# Altium footprint library General.PcbLib: 446 footprints (part 22 of 28)
Each footprint in its own frame and in the unit in brackets; x right, y up, seen from the top. Pads: shape width x height; smd on the part's side, far side on the other; paste and mask are expansions set on the pad; w line width, h text height; cw(c..) or ccw(c..) is an arc to the next point about the centre after c.
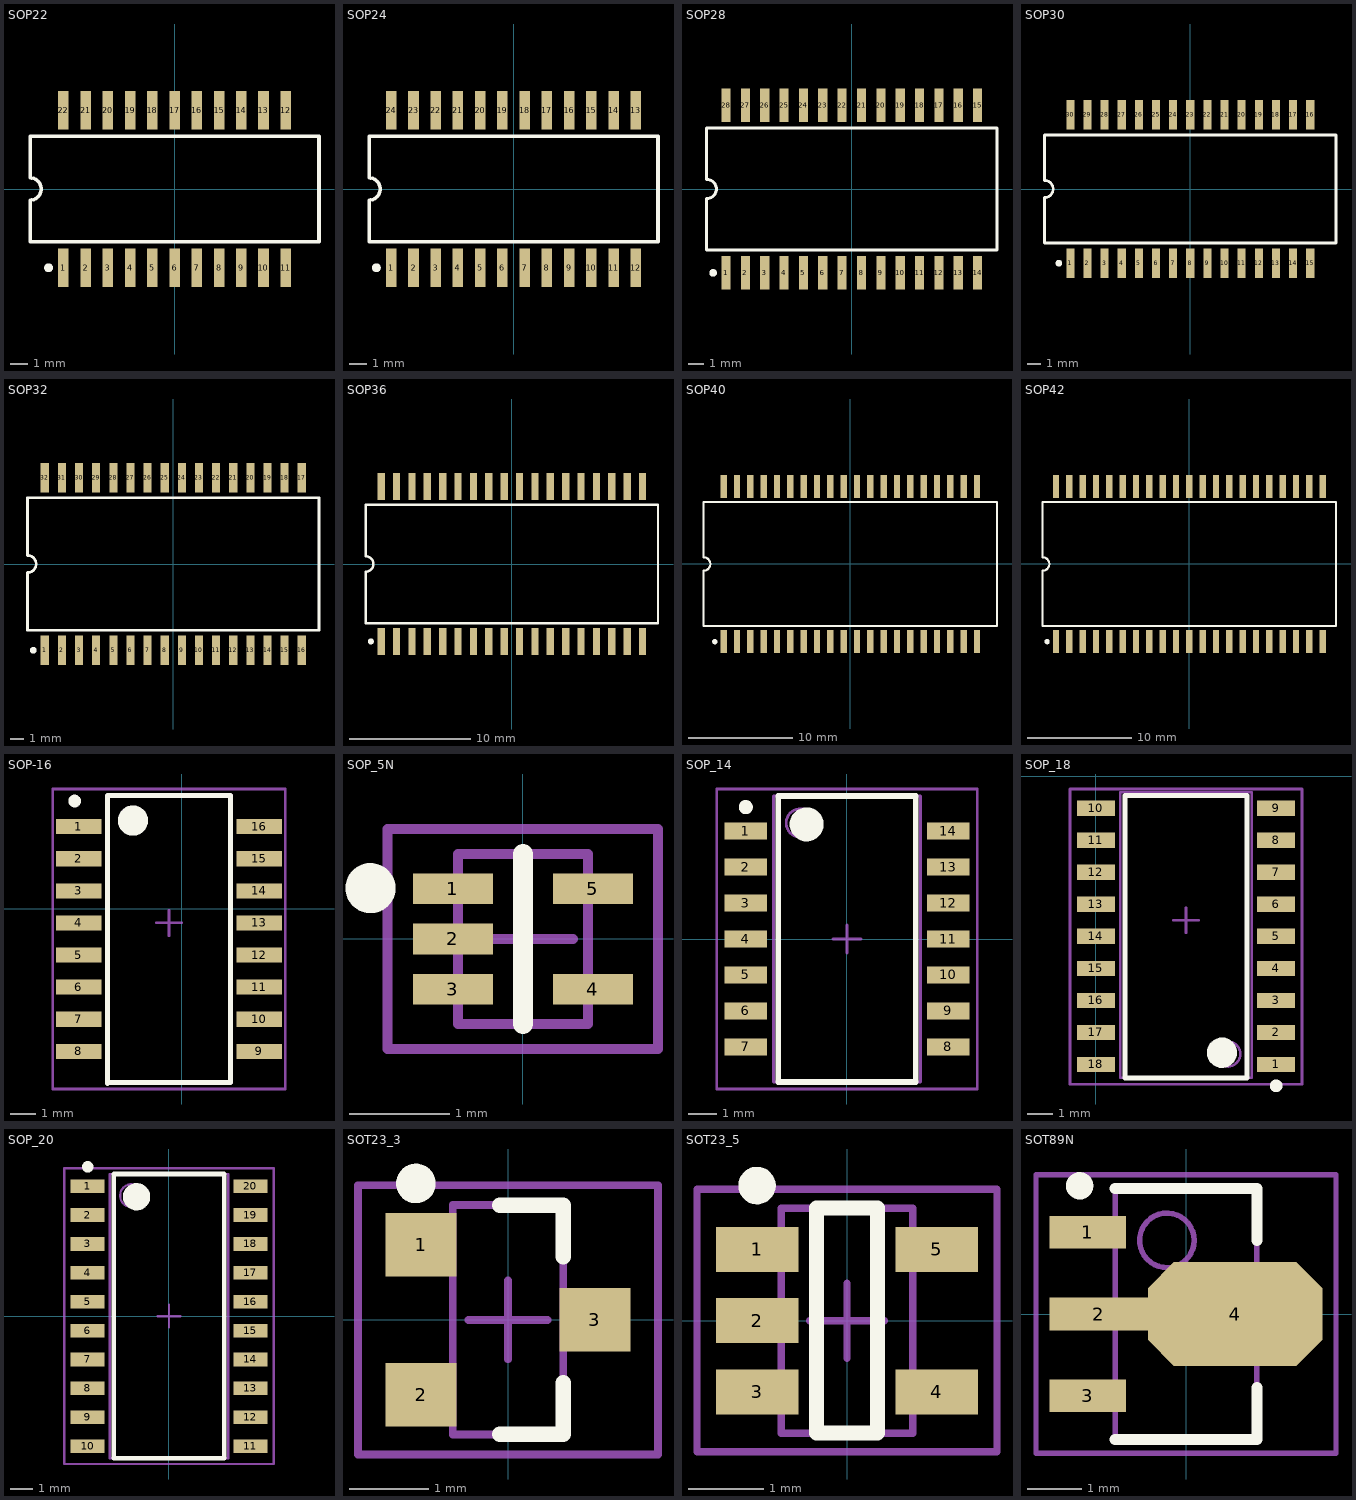
[diagram p21: the footprints below, top view; thin cyan lines are the x and y axes]

## SOP22 [mm] "Small Outline; 22 Leads; Body Width 7.2 mm; Pitch 1.27 mm"
height 2.5
pads (22):
  rect 0.6x2.2 smd: 1(-6.35,-4.5) 2(-5.08,-4.5) 3(-3.81,-4.5) 4(-2.54,-4.5) 5(-1.27,-4.5) 6(0,-4.5) 7(1.27,-4.5) 8(2.54,-4.5) 9(3.81,-4.5) 10(5.08,-4.5) 11(6.35,-4.5) 12(6.35,4.5) 13(5.08,4.5) 14(3.81,4.5) 15(2.54,4.5) 16(1.27,4.5) 17(0,4.5) 18(-1.27,4.5) 19(-2.54,4.5) 20(-3.81,4.5) 21(-5.08,4.5) 22(-6.35,4.5)
Top Overlay:
  circle w0.25: c-7.2,-4.5 r0.125
  lines w0.2: -8.25,-3 -8.25,-0.635 ccw(c-8.25,0) -8.25,0.635 -8.25,3 8.25,3 8.25,-3 -8.25,-3

## SOP24 [mm] "Small Outline; 24 Leads; Body Width 7.2 mm; Pitch 1.27 mm"
height 2.5
pads (24):
  rect 0.6x2.2 smd: 1(-6.985,-4.5) 2(-5.715,-4.5) 3(-4.445,-4.5) 4(-3.175,-4.5) 5(-1.905,-4.5) 6(-0.635,-4.5) 7(0.635,-4.5) 8(1.905,-4.5) 9(3.175,-4.5) 10(4.445,-4.5) 11(5.715,-4.5) 12(6.985,-4.5) 13(6.985,4.5) 14(5.715,4.5) 15(4.445,4.5) 16(3.175,4.5) 17(1.905,4.5) 18(0.635,4.5) 19(-0.635,4.5) 20(-1.905,4.5) 21(-3.175,4.5) 22(-4.445,4.5) 23(-5.715,4.5) 24(-6.985,4.5)
Top Overlay:
  circle w0.25: c-7.835,-4.5 r0.125
  lines w0.2: -8.25,-3 -8.25,-0.635 ccw(c-8.25,0) -8.25,0.635 -8.25,3 8.25,3 8.25,-3 -8.25,-3

## SOP28 [mm] "Small Outline; 28 Leads; Body Width 9.1 mm; Pitch 1.27 mm"
height 3
pads (28):
  rect 0.6x2.2 smd: 1(-8.255,-5.5) 2(-6.985,-5.5) 3(-5.715,-5.5) 4(-4.445,-5.5) 5(-3.175,-5.5) 6(-1.905,-5.5) 7(-0.635,-5.5) 8(0.635,-5.5) 9(1.905,-5.5) 10(3.175,-5.5) 11(4.445,-5.5) 12(5.715,-5.5) 13(6.985,-5.5) 14(8.255,-5.5) 15(8.255,5.5) 16(6.985,5.5) 17(5.715,5.5) 18(4.445,5.5) 19(3.175,5.5) 20(1.905,5.5) 21(0.635,5.5) 22(-0.635,5.5) 23(-1.905,5.5) 24(-3.175,5.5) 25(-4.445,5.5) 26(-5.715,5.5) 27(-6.985,5.5) 28(-8.255,5.5)
Top Overlay:
  circle w0.25: c-9.105,-5.5 r0.125
  lines w0.2: -9.525,-4 -9.525,-0.635 ccw(c-9.525,0) -9.525,0.635 -9.525,4 9.525,4 9.525,-4 -9.525,-4

## SOP30 [mm] "Small Outline; 30 Leads; Body Width 9.1 mm; Pitch 1.27 mm"
height 3
pads (30):
  rect 0.6x2.2 smd: 1(-8.89,-5.5) 2(-7.62,-5.5) 3(-6.35,-5.5) 4(-5.08,-5.5) 5(-3.81,-5.5) 6(-2.54,-5.5) 7(-1.27,-5.5) 8(0,-5.5) 9(1.27,-5.5) 10(2.54,-5.5) 11(3.81,-5.5) 12(5.08,-5.5) 13(6.35,-5.5) 14(7.62,-5.5) 15(8.89,-5.5) 16(8.89,5.5) 17(7.62,5.5) 18(6.35,5.5) 19(5.08,5.5) 20(3.81,5.5) 21(2.54,5.5) 22(1.27,5.5) 23(0,5.5) 24(-1.27,5.5) 25(-2.54,5.5) 26(-3.81,5.5) 27(-5.08,5.5) 28(-6.35,5.5) 29(-7.62,5.5) 30(-8.89,5.5)
Top Overlay:
  circle w0.25: c-9.74,-5.5 r0.125
  lines w0.2: -10.8,-4 10.8,-4 10.8,4 -10.8,4 -10.8,0.635 cw(c-10.8,0) -10.8,-0.635 -10.8,-4

## SOP32 [mm] "Small Outline; 32 Leads; Body Width 11 mm; Pitch 1.27 mm"
height 3.5
pads (32):
  rect 0.6x2.2 smd: 1(-9.525,-6.4) 2(-8.255,-6.4) 3(-6.985,-6.4) 4(-5.715,-6.4) 5(-4.445,-6.4) 6(-3.175,-6.4) 7(-1.905,-6.4) 8(-0.635,-6.4) 9(0.635,-6.4) 10(1.905,-6.4) 11(3.175,-6.4) 12(4.445,-6.4) 13(5.715,-6.4) 14(6.985,-6.4) 15(8.255,-6.4) 16(9.525,-6.4) 17(9.525,6.4) 18(8.255,6.4) 19(6.985,6.4) 20(5.715,6.4) 21(4.445,6.4) 22(3.175,6.4) 23(1.905,6.4) 24(0.635,6.4) 25(-0.635,6.4) 26(-1.905,6.4) 27(-3.175,6.4) 28(-4.445,6.4) 29(-5.715,6.4) 30(-6.985,6.4) 31(-8.255,6.4) 32(-9.525,6.4)
Top Overlay:
  circle w0.25: c-10.375,-6.4 r0.125
  lines w0.2: -10.8,-4.9 -10.8,-0.635 ccw(c-10.8,0) -10.8,0.635 -10.8,4.9 10.8,4.9 10.8,-4.9 -10.8,-4.9

## SOP36 [mm] "Small Outline; 36 Leads; Body Width 11 mm; Pitch 1.27 mm"
height 3.5
pads (36):
  rect 0.6x2.2 smd: 1(-10.795,-6.4) 2(-9.525,-6.4) 3(-8.255,-6.4) 4(-6.985,-6.4) 5(-5.715,-6.4) 6(-4.445,-6.4) 7(-3.175,-6.4) 8(-1.905,-6.4) 9(-0.635,-6.4) 10(0.635,-6.4) 11(1.905,-6.4) 12(3.175,-6.4) 13(4.445,-6.4) 14(5.715,-6.4) 15(6.985,-6.4) 16(8.255,-6.4) 17(9.525,-6.4) 18(10.795,-6.4) 19(10.795,6.4) 20(9.525,6.4) 21(8.255,6.4) 22(6.985,6.4) 23(5.715,6.4) 24(4.445,6.4) 25(3.175,6.4) 26(1.905,6.4) 27(0.635,6.4) 28(-0.635,6.4) 29(-1.905,6.4) 30(-3.175,6.4) 31(-4.445,6.4) 32(-5.715,6.4) 33(-6.985,6.4) 34(-8.255,6.4) 35(-9.525,6.4) 36(-10.795,6.4)
Top Overlay:
  circle w0.25: c-11.645,-6.4 r0.125
  lines w0.2: -12.075,-4.9 12.075,-4.9 12.075,4.9 -12.075,4.9 -12.075,0.635 cw(c-12.075,0) -12.075,-0.635 -12.075,-4.9

## SOP40 [mm] "Small Outline; 40 Leads; Body Width 12.9 mm; Pitch 1.27 mm"
height 4
pads (40):
  rect 0.6x2.2 smd: 1(-12.065,-7.4) 2(-10.795,-7.4) 3(-9.525,-7.4) 4(-8.255,-7.4) 5(-6.985,-7.4) 6(-5.715,-7.4) 7(-4.445,-7.4) 8(-3.175,-7.4) 9(-1.905,-7.4) 10(-0.635,-7.4) 11(0.635,-7.4) 12(1.905,-7.4) 13(3.175,-7.4) 14(4.445,-7.4) 15(5.715,-7.4) 16(6.985,-7.4) 17(8.255,-7.4) 18(9.525,-7.4) 19(10.795,-7.4) 20(12.065,-7.4) 21(12.065,7.4) 22(10.795,7.4) 23(9.525,7.4) 24(8.255,7.4) 25(6.985,7.4) 26(5.715,7.4) 27(4.445,7.4) 28(3.175,7.4) 29(1.905,7.4) 30(0.635,7.4) 31(-0.635,7.4) 32(-1.905,7.4) 33(-3.175,7.4) 34(-4.445,7.4) 35(-5.715,7.4) 36(-6.985,7.4) 37(-8.255,7.4) 38(-9.525,7.4) 39(-10.795,7.4) 40(-12.065,7.4)
Top Overlay:
  circle w0.25: c-12.915,-7.4 r0.125
  lines w0.2: -13.975,-5.9 13.975,-5.9 13.975,5.9 -13.975,5.9 -13.975,0.635 cw(c-13.975,0) -13.975,-0.635 -13.975,-5.9

## SOP42 [mm] "Small Outline; 42 Leads; Body Width 12.9 mm; Pitch 1.27 mm"
height 4
pads (42):
  rect 0.6x2.2 smd: 1(-12.7,-7.4) 2(-11.43,-7.4) 3(-10.16,-7.4) 4(-8.89,-7.4) 5(-7.62,-7.4) 6(-6.35,-7.4) 7(-5.08,-7.4) 8(-3.81,-7.4) 9(-2.54,-7.4) 10(-1.27,-7.4) 11(0,-7.4) 12(1.27,-7.4) 13(2.54,-7.4) 14(3.81,-7.4) 15(5.08,-7.4) 16(6.35,-7.4) 17(7.62,-7.4) 18(8.89,-7.4) 19(10.16,-7.4) 20(11.43,-7.4) 21(12.7,-7.4) 22(12.7,7.4) 23(11.43,7.4) 24(10.16,7.4) 25(8.89,7.4) 26(7.62,7.4) 27(6.35,7.4) 28(5.08,7.4) 29(3.81,7.4) 30(2.54,7.4) 31(1.27,7.4) 32(0,7.4) 33(-1.27,7.4) 34(-2.54,7.4) 35(-3.81,7.4) 36(-5.08,7.4) 37(-6.35,7.4) 38(-7.62,7.4) 39(-8.89,7.4) 40(-10.16,7.4) 41(-11.43,7.4) 42(-12.7,7.4)
Top Overlay:
  circle w0.25: c-13.55,-7.4 r0.125
  lines w0.2: -13.975,-5.9 13.975,-5.9 13.975,5.9 -13.975,5.9 -13.975,0.635 cw(c-13.975,0) -13.975,-0.635 -13.975,-5.9

## SOP-16 [mm]
pads (16):
  rect 1.8x0.6 smd: 1(-4.07,3.251) 2(-4.07,1.981) 3(-4.07,0.711) 4(-4.07,-0.559) 5(-4.07,-1.829) 6(-4.07,-3.099) 7(-4.07,-4.369) 8(-4.07,-5.639) 9(3.08,-5.639) 10(3.08,-4.369) 11(3.08,-3.099) 12(3.08,-1.829) 13(3.08,-0.559) 14(3.08,0.711) 15(3.08,1.981) 16(3.08,3.251)
Top Overlay:
  circle w0.6: c-1.92,3.491 r0.3
  circle w0.25: c-4.229,4.265 r0.125
  lines w0.2: -2.92,-6.879 1.93,-6.879 ; 1.93,-6.858 1.93,4.491 -2.92,4.491 ; -2.92,4.491 -2.92,-6.909 -2.92,4.491
Mechanical 13:
  circle w0.1: c-1.943,3.523 r0.5
  lines w0.1: -2.908,-6.879 -2.908,4.491 1.994,4.491 1.994,-6.879 -2.908,-6.879
Mechanical 15:
  lines w0.1: -5.095,-7.129 4.105,-7.129 ; -5.095,-7.112 -5.095,4.741 4.105,4.741 4.105,-7.112 ; -0.995,-0.559 0.005,-0.559 ; -0.495,-1.059 -0.495,-0.059
3D body: height 2.1, standoff 0.1, extent -2.934,-6.883 1.943,4.491

## SOP_5N [mm] "SOT23, 5-Leads, Body 1.7x1.7mm (max), Pitch 0.50mm, IPC Medium Density"
height 1.1
pads (5):
  rect 0.8x0.305 smd: 1(-0.7,0.5) 2(-0.7,0) 3(-0.7,-0.5) 4(0.7,-0.5) 5(0.7,0.5)
Top Overlay:
  circle w0.25: c-1.522,0.508 r0.125
  lines w0.2: 0,-0.85 0,0.85 0,-0.85
Mechanical 13:
  lines w0.1: -0.65,-0.85 0.65,-0.85 0.65,0.85 -0.65,0.85 -0.65,-0.85
Mechanical 15:
  lines w0.1: -0.5,0 0.5,0 ; 0,-0.5 0,0.5 ; -1.35,-1.1 1.35,-1.1 1.35,1.1 -1.35,1.1 -1.35,-1.1
3D body: height 1.1, standoff 0.05, extent -0.65,-0.85 0.65,0.85

## SOP_14 [mm] "SOP, 14-Leads, Body 10.1x5.2mm (max), Pitch 1.27mm, IPC Medium Density"
height 21
pads (14):
  rect 1.5x0.6 smd: 1(-3.575,3.81) 2(-3.575,2.54) 3(-3.575,1.27) 4(-3.575,0) 5(-3.575,-1.27) 6(-3.575,-2.54) 7(-3.575,-3.81) 8(3.575,-3.81) 9(3.575,-2.54) 10(3.575,-1.27) 11(3.575,0) 12(3.575,1.27) 13(3.575,2.54) 14(3.575,3.81)
Top Overlay:
  circle w0.25: c-3.575,4.66 r0.125
  circle w0.6: c-1.425,4.05 r0.3
  lines w0.2: -2.425,-5.05 -2.425,5.05 2.425,5.05 2.425,-5.05 -2.425,-5.05
Mechanical 13:
  circle w0.1: c-1.65,4.1 r0.5
  lines w0.1: -2.6,-5.05 -2.6,5.05 2.6,5.05 2.6,-5.05 -2.6,-5.05
Mechanical 15:
  lines w0.1: -0.5,0 0.5,0 ; 0,-0.5 0,0.5 ; -4.6,-5.3 -4.6,5.3 4.6,5.3 4.6,-5.3 -4.6,-5.3
3D body: height 2.1, standoff 0.1, extent -2.6,-5.05 2.6,5.05

## SOP_18 [mm]
pads (18):
  rect 1.5x0.6 smd: 1(7.15,-11.43) 2(7.15,-10.16) 3(7.15,-8.89) 4(7.15,-7.62) 5(7.15,-6.35) 6(7.15,-5.08) 7(7.15,-3.81) 8(7.15,-2.54) 9(7.15,-1.27) 10(0,-1.27) 11(0,-2.54) 12(0,-3.81) 13(0,-5.08) 14(0,-6.35) 15(0,-7.62) 16(0,-8.89) 17(0,-10.16) 18(0,-11.43)
Top Overlay:
  circle w0.6: c5,-10.965 r0.3
  circle w0.25: c7.15,-12.28 r0.125
  lines w0.2: 1.15,-11.965 6,-11.965 6,-0.762 1.15,-0.762 1.15,-11.965
Mechanical 13:
  circle w0.1: c5.225,-11.015 r0.5
  lines w0.1: 0.975,-11.965 6.175,-11.965 6.175,-0.635 0.975,-0.635 0.975,-11.965
Mechanical 15:
  lines w0.1: 3.075,-5.715 4.075,-5.715 ; 3.575,-6.215 3.575,-5.215 ; -1.025,-12.215 8.175,-12.215 8.175,-0.508 -1.025,-0.508 -1.025,-12.215
3D body: height 2.1, standoff 0.1, extent 1.016,-11.938 6.223,-0.635

## SOP_20 [mm] "SOP, 20-Leads, Body 12.5x5.2mm (max), Pitch 1.27mm, IPC Medium Density"
height 21
pads (20):
  rect 1.5x0.6 smd: 1(-3.575,5.715) 2(-3.575,4.445) 3(-3.575,3.175) 4(-3.575,1.905) 5(-3.575,0.635) 6(-3.575,-0.635) 7(-3.575,-1.905) 8(-3.575,-3.175) 9(-3.575,-4.445) 10(-3.575,-5.715) 11(3.575,-5.715) 12(3.575,-4.445) 13(3.575,-3.175) 14(3.575,-1.905) 15(3.575,-0.635) 16(3.575,0.635) 17(3.575,1.905) 18(3.575,3.175) 19(3.575,4.445) 20(3.575,5.715)
Top Overlay:
  circle w0.25: c-3.575,6.565 r0.125
  circle w0.6: c-1.425,5.25 r0.3
  lines w0.2: -2.425,-6.25 -2.425,6.25 2.425,6.25 2.425,-6.25 -2.425,-6.25
Mechanical 13:
  circle w0.1: c-1.65,5.3 r0.5
  lines w0.1: -2.6,-6.25 -2.6,6.25 2.6,6.25 2.6,-6.25 -2.6,-6.25
Mechanical 15:
  lines w0.1: -0.5,0 0.5,0 ; 0,-0.5 0,0.5 ; -4.6,-6.5 -4.6,6.5 4.6,6.5 4.6,-6.5 -4.6,-6.5
3D body: height 2.1, standoff 0.1, extent -2.6,-6.25 2.6,6.25

## SOT23_3 [mm] "SOT23, 3-Leads, Body 2.9x2.5mm (max), Pitch 0.95mm, IPC Medium Density"
height 1
pads (3):
  rect 0.9x0.8 smd: 1(-1.1,0.95) 2(-1.1,-0.95) 3(1.1,0)
Top Overlay:
  circle w0.25: c-1.166,1.727 r0.125
  lines w0.2: -0.1,-1.45 0.7,-1.45 0.7,-0.8 ; -0.1,1.45 0.7,1.45 0.7,0.8
Mechanical 13:
  lines w0.1: -0.7,-1.455 0.7,-1.455 0.7,1.455 -0.7,1.455 -0.7,-1.455
Mechanical 15:
  lines w0.1: -0.5,0 0.5,0 ; 0,-0.5 0,0.5 ; -1.9,-1.705 1.9,-1.705 1.9,1.705 -1.9,1.705 -1.9,-1.705
3D body "SW3dPS-sot-3p290x130ll237h100.STEP": height 1, standoff 0, extent -1.236,-1.422 1.134,1.478

## SOT23_5 [mm] "SOT23, 5-Leads, Body 3.0x3.0mm (max), Pitch 0.95mm, IPC Medium Density"
height 1.2
pads (5):
  rect 1.1x0.6 smd: 1(-1.2,0.95) 2(-1.2,0) 3(-1.2,-0.95) 4(1.2,-0.95) 5(1.2,0.95)
Top Overlay:
  circle w0.25: c-1.2,1.8 r0.125
  lines w0.2: -0.406,-1.5 0.406,-1.5 0.406,1.5 -0.406,1.5 -0.406,-1.5
Mechanical 13:
  lines w0.1: -0.875,-1.5 -0.875,1.5 0.875,1.5 0.875,-1.5 -0.875,-1.5
Mechanical 15:
  lines w0.1: -0.5,0 0.5,0 ; 0,-0.5 0,0.5 ; -2,-1.75 -2,1.75 2,1.75 2,-1.75 -2,-1.75
3D body "SW3dPS-SOT23-5.STEP": height 1.11, standoff 0.01, extent -1.4,-1.452 1.4,1.448

## SOT89N [mm] "SOT89, 3-Leads, Body 4.5x2.4 mm, Pitch 1.5mm, Lead Span 4.1mm, IPC Medium Density"
height 1.6
pads (4):
  rect 1.4x0.6 smd: 1(-1.8,1.5) 3(-1.8,-1.5)
  rect 1.8x0.6 smd: 2(-1.6,0)
  oct 3.2x1.9 smd: 4(0.9,0)
Top Overlay:
  circle w0.25: c-1.95,2.35 r0.125
  lines w0.2: -1.3,-2.3 1.3,-2.3 1.3,-1.35 ; -1.3,2.3 1.3,2.3 1.3,1.35
Mechanical 13:
  circle w0.1: c-0.35,1.35 r0.5
  lines w0.1: -1.3,-2.3 -1.3,2.3 1.3,2.3 1.3,-2.3 -1.3,-2.3
Mechanical 15:
  lines w0.1: -0.5,0 0.5,0 ; 0,-0.5 0,0.5 ; -2.75,-2.55 -2.75,2.55 2.75,2.55 2.75,-2.55 -2.75,-2.55
3D body: height 1.6, standoff 0, extent -1.3,-2.3 1.3,2.3